# Altium footprint library STM32F0.PcbLib: 228 footprints (part 9 of 16)
Each footprint in its own frame and in the unit in brackets; x right, y up, seen from the top. Pads: shape width x height; smd on the part's side, far side on the other; paste and mask are expansions set on the pad; w line width, h text height; cw(c..) or ccw(c..) is an arc to the next point about the centre after c.
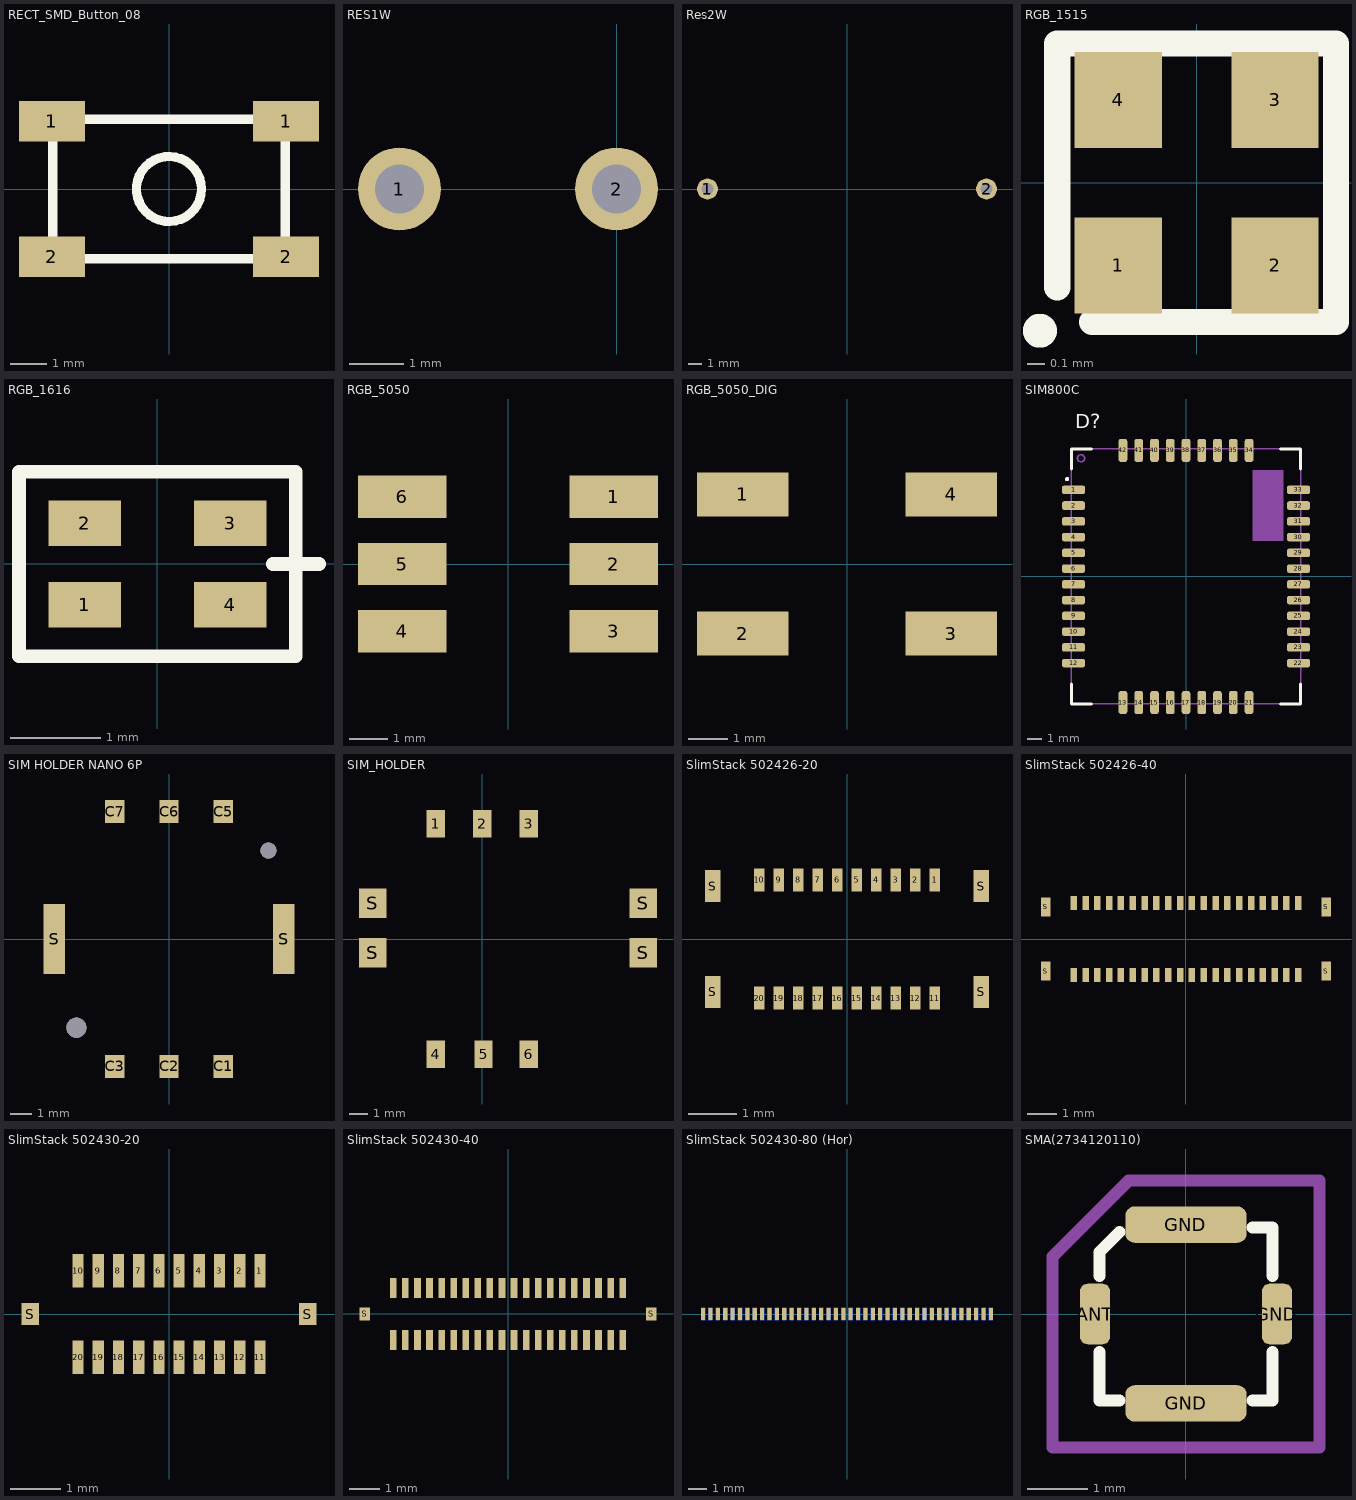
[diagram p8: the footprints below, top view; thin cyan lines are the x and y axes]

## RECT_SMD_Button_08 [mm]
pads (4):
  rect 1.8x1.1 smd: 1(-3.2,1.85) 1(3.2,1.85) 2(-3.2,-1.85) 2(3.2,-1.85)
Top Overlay:
  circle w0.254: c0,0 r0.889
  lines w0.254: -3.175,-1.27 -3.175,1.27 ; -2.413,-1.905 2.413,-1.905 ; -2.413,1.905 2.413,1.905 ; 3.175,-1.27 3.175,1.27
3D body "User Library-LP16.step": height 1.5, standoff 0, extent -3.2,-2.55 3.2,2.55

## RES1W [mil]
pads (2):
  round 60 hole 35.43: 1(-157.48,0) 2(0,0)
3D body "User Library-Resistor KNP-100.step": height 724.41, standoff -39.37, extent -173.22,-79.13 79.14,79.14

## Res2W [mil]
pads (2):
  round 60 hole 35.43: 1(-400,0) 2(400,0)
3D body "User Library-RES 2W -H  L=15 D=5 d=0,8 Pin2Pin=20,32.STEP": height 295.28, standoff -100.13, extent -415.36,-98.19 416.13,98.66

## RGB_1515 [mm]
pads (4):
  rect 0.5x0.55 smd: 1(-0.45,-0.475) 2(0.45,-0.475) 3(0.45,0.475) 4(-0.45,0.475)
Top Overlay:
  circle w0.15: c-0.9,-0.85 r0.022
  lines w0.15: -0.8,-0.6 -0.8,0.8 0.8,0.8 0.8,-0.8 -0.6,-0.8
3D body: height 0.78, standoff 0, extent -0.8,-0.8 0.8,0.8

## RGB_1616 [mm]
pads (4):
  rect 0.8x0.5 smd: 1(-0.8,-0.45) 2(-0.8,0.45) 3(0.8,0.45) 4(0.8,-0.45)
Top Overlay:
  lines w0.15: 1.27,0 1.524,0 1.778,0 ; -1.524,-1.016 -1.524,1.016 1.524,1.016 1.524,-1.016 -1.524,-1.016

## RGB_5050 [mm]
pads (6):
  rect 2.3x1.1 smd: 1(2.75,1.75) 2(2.75,0) 3(2.75,-1.75) 4(-2.75,-1.75) 5(-2.75,0) 6(-2.75,1.75)
3D body "User Library-APA102C.step": height 1.5, standoff -0.05, extent -2.75,-2.5 2.75,2.5

## RGB_5050_DIG [mm]
pads (4):
  rect 2.3x1.1 smd: 1(-2.625,1.75) 2(-2.625,-1.75) 3(2.625,-1.75) 4(2.625,1.75)
3D body "User Library-ws2812B-1.step": height 1.6, standoff 0.03, extent -2.7,-2.5 2.7,2.5

## SIM800C [mm] "SIM800C modem"
height 2.3
pads (42):
  rrect50% 1.6x0.6 smd: 1(-7.85,6.05) 2(-7.85,4.95) 3(-7.85,3.85) 4(-7.85,2.75) 5(-7.85,1.65) 6(-7.85,0.55) 7(-7.85,-0.55) 8(-7.85,-1.65) 9(-7.85,-2.75) 10(-7.85,-3.85) 11(-7.85,-4.95) 12(-7.85,-6.05) 22(7.85,-6.05) 23(7.85,-4.95) 24(7.85,-3.85) 25(7.85,-2.75) 26(7.85,-1.65) 27(7.85,-0.55) 28(7.85,0.55) 29(7.85,1.65) 30(7.85,2.75) 31(7.85,3.85) 32(7.85,4.95) 33(7.85,6.05)
  rrect50% 0.6x1.6 smd: 13(-4.4,-8.8) 14(-3.3,-8.8) 15(-2.2,-8.8) 16(-1.1,-8.8) 17(0,-8.8) 18(1.1,-8.8) 19(2.2,-8.8) 20(3.3,-8.8) 21(4.4,-8.8) 34(4.4,8.8) 35(3.3,8.8) 36(2.2,8.8) 37(1.1,8.8) 38(0,8.8) 39(-1.1,8.8) 40(-2.2,8.8) 41(-3.3,8.8) 42(-4.4,8.8)
Top Overlay:
  circle w0.2: c-8.3,6.8 r0.05
  lines w0.2: -8,-7.5 -8,-8.9 -6.6,-8.9 ; -8,7.5 -8,8.9 -6.6,8.9 ; 6.6,-8.9 8,-8.9 8,-7.5 ; 6.6,8.9 8,8.9 8,7.5
  text "D?" at -7.72,10.34 h1
Top Assembly:
  circle w0.1: c-7.325,8.25 r0.25
  lines w0.1: -8,-8.9 -8,8.9 8,8.9 8,-8.9 -8,-8.9
Mechanical 20:
  rectangle: 4.65,2.48 6.8,7.43
3D body "SIM800C.STEP": height 2.34, standoff 0, extent -7.85,-8.8 7.85,8.8

## SIM HOLDER NANO 6P [mm]
pads (10):
  rect 0.9x1.1 smd: C1(2.54,-5.97) C2(0,-5.97) C3(-2.54,-5.97) C5(2.54,5.98) C6(0,5.98) C7(-2.54,5.98)
  rect 1x3.29 smd: S(-5.385,0) S(5.385,0)
  round 0.95 hole 0.95 unplated: ""(-4.34,-4.15)
  round 0.75 hole 0.75 unplated: ""(4.66,4.15)
3D body "xksim-304.stp": height 1.4, standoff -0.3, extent -5.425,-6.15 5.425,6.15

## SIM_HOLDER [mm]
pads (10):
  rect 1x1.5 smd: 1(-2.54,6.3) 2(0,6.3) 3(2.54,6.3) 4(-2.54,-6.3) 5(0.07,-6.3) 6(2.54,-6.3)
  rect 1.5x1.6 smd: S(-6,-0.75) S(-6,1.95) S(8.81,-0.75) S(8.81,1.95)
3D body "693010010601.stp": height 1.7, standoff 0, extent -6.75,-6.81 9.55,9.29

## SlimStack 502426-20 [mm]
pads (24):
  rect 0.22x0.475 smd: 1(1.8,1.212) 2(1.4,1.212) 3(1,1.212) 4(0.6,1.212) 5(0.2,1.212) 6(-0.2,1.212) 7(-0.6,1.212) 8(-1,1.212) 9(-1.4,1.212) 10(-1.8,1.212) 11(1.8,-1.212) 12(1.4,-1.212) 13(1,-1.212) 14(0.6,-1.212) 15(0.2,-1.212) 16(-0.2,-1.212) 17(-0.6,-1.212) 18(-1,-1.212) 19(-1.4,-1.212) 20(-1.8,-1.212)
  rect 0.32x0.65 smd: S(-2.75,-1.085) S(-2.75,1.085) S(2.75,-1.085) S(2.75,1.085)
3D body "5024262012.stp": height 0.98, standoff -0.02, extent -3.55,-1.3 3.55,1.3

## SlimStack 502426-40 [mm]
pads (44):
  rect 0.22x0.475 smd: 1(-3.8,1.212) 2(-3.4,1.212) 3(-3,1.212) 4(-2.6,1.212) 5(-2.2,1.212) 6(-1.8,1.212) 7(-1.4,1.212) 8(-1,1.212) 9(-0.6,1.212) 10(-0.2,1.212) 11(0.2,1.212) 12(0.6,1.212) 13(1,1.212) 14(1.4,1.212) 15(1.8,1.212) 16(2.2,1.212) 17(2.6,1.212) 18(3,1.212) 19(3.4,1.212) 20(3.8,1.212) 21(-3.8,-1.212) 22(-3.4,-1.212) 23(-3,-1.212) 24(-2.6,-1.212) 25(-2.2,-1.212) 26(-1.8,-1.212) 27(-1.4,-1.212) 28(-1,-1.212) 29(-0.6,-1.212) 30(-0.2,-1.212) 31(0.2,-1.212) 32(0.6,-1.212) 33(1,-1.212) 34(1.4,-1.212) 35(1.8,-1.212) 36(2.2,-1.212) 37(2.6,-1.212) 38(3,-1.212) 39(3.4,-1.212) 40(3.8,-1.212)
  rect 0.32x0.65 smd: S(-4.75,-1.085) S(-4.75,1.085) S(4.75,-1.085) S(4.75,1.085)
3D body "502426-4010.stp": height 0.99, standoff -0.01, extent -5.55,-1.3 5.55,1.3

## SlimStack 502430-20 [mm]
pads (22):
  rect 0.22x0.66 smd: 1(1.8,0.855) 2(1.4,0.855) 3(1,0.855) 4(0.6,0.855) 5(0.2,0.855) 6(-0.2,0.855) 7(-0.6,0.855) 8(-1,0.855) 9(-1.4,0.855) 10(-1.8,0.855) 11(1.8,-0.855) 12(1.4,-0.855) 13(1,-0.855) 14(0.6,-0.855) 15(0.2,-0.855) 16(-0.2,-0.855) 17(-0.6,-0.855) 18(-1,-0.855) 19(-1.4,-0.855) 20(-1.8,-0.855)
  rect 0.35x0.44 smd: S(-2.75,0) S(2.75,0)
3D body "5024302030.stp": height 0.78, standoff -0.02, extent -3.13,-1.04 3.13,1.04

## SlimStack 502430-40 [mm]
pads (42):
  rect 0.22x0.66 smd: 1(-3.8,0.855) 2(-3.4,0.855) 3(-3,0.855) 4(-2.6,0.855) 5(-2.2,0.855) 6(-1.8,0.855) 7(-1.4,0.855) 8(-1,0.855) 9(-0.6,0.855) 10(-0.2,0.855) 11(0.2,0.855) 12(0.6,0.855) 13(1,0.855) 14(1.4,0.855) 15(1.8,0.855) 16(2.2,0.855) 17(2.6,0.855) 18(3,0.855) 19(3.4,0.855) 20(3.8,0.855) 21(-3.8,-0.855) 22(-3.4,-0.855) 23(-3,-0.855) 24(-2.6,-0.855) 25(-2.2,-0.855) 26(-1.8,-0.855) 27(-1.4,-0.855) 28(-1,-0.855) 29(-0.6,-0.855) 30(-0.2,-0.855) 31(0.2,-0.855) 32(0.6,-0.855) 33(1,-0.855) 34(1.4,-0.855) 35(1.8,-0.855) 36(2.2,-0.855) 37(2.6,-0.855) 38(3,-0.855) 39(3.4,-0.855) 40(3.8,-0.855)
  rect 0.35x0.44 smd: S(-4.75,0) S(4.75,0)
3D body "502430-4010.stp": height 0.78, standoff -0.02, extent -5.13,-1.04 5.13,1.04

## SlimStack 502430-80 (Hor) [mm]
pads (80):
  rect 0.22x0.66 smd: 1(7.8,0) 2(7.4,0) 3(7,0) 4(6.6,0) 5(6.2,0) 6(5.8,0) 7(5.4,0) 8(5,0) 9(4.6,0) 10(4.2,0) 11(3.8,0) 12(3.4,0) 13(3,0) 14(2.6,0) 15(2.2,0) 16(1.8,0) 17(1.4,0) 18(1,0) 19(0.6,0) 20(0.2,0) 21(-0.2,0) 22(-0.6,0) 23(-1,0) 24(-1.4,0) 25(-1.8,0) 26(-2.2,0) 27(-2.6,0) 28(-3,0) 29(-3.4,0) 30(-3.8,0) 31(-4.2,0) 32(-4.6,0) 33(-5,0) 34(-5.4,0) 35(-5.8,0) 36(-6.2,0) 37(-6.6,0) 38(-7,0) 39(-7.4,0) 40(-7.8,0)
  rect 0.22x0.66 smd far side: 41(7.8,0) 42(7.4,0) 43(7,0) 44(6.6,0) 45(6.2,0) 46(5.8,0) 47(5.4,0) 48(5,0) 49(4.6,0) 50(4.2,0) 51(3.8,0) 52(3.4,0) 53(3,0) 54(2.6,0) 55(2.2,0) 56(1.8,0) 57(1.4,0) 58(1,0) 59(0.6,0) 60(0.2,0) 61(-0.2,0) 62(-0.6,0) 63(-1,0) 64(-1.4,0) 65(-1.8,0) 66(-2.2,0) 67(-2.6,0) 68(-3,0) 69(-3.4,0) 70(-3.8,0) 71(-4.2,0) 72(-4.6,0) 73(-5,0) 74(-5.4,0) 75(-5.8,0) 76(-6.2,0) 77(-6.6,0) 78(-7,0) 79(-7.4,0) 80(-7.8,0)
3D body "5024308030.step": height 0.22, standoff -1.32, extent -9.13,-1.18 9.13,-0.075

## SMA(2734120110) [mm]
pads (4):
  rrect50% 0.5x1 smd: ANT(-1.5,0) GND(1.5,0)
  rrect50% 2x0.6 smd: GND(0,1.475) GND(0,-1.475)
Top Overlay:
  lines w0.2: -1.425,-0.625 -1.425,-1.425 -1.1,-1.425 ; -1.425,0.625 -1.425,1.025 -1.1,1.35 ; 1.1,-1.425 1.425,-1.425 1.425,-0.625 ; 1.1,1.425 1.425,1.425 1.425,0.625
Top Assembly:
  lines w0.2: -2.2,-2.2 2.2,-2.2 2.2,2.2 -0.95,2.2 -2.2,0.95 -2.2,-2.2
3D body "734120110.stp": height 1.3, standoff 0, extent -1.54,-1.5 1.54,1.5